# Altium footprint library connectors.PcbLib: 256 footprints (part 3 of 16)
Each footprint in its own frame and in the unit in brackets; x right, y up, seen from the top. Pads: shape width x height; smd on the part's side, far side on the other; paste and mask are expansions set on the pad; w line width, h text height; cw(c..) or ccw(c..) is an arc to the next point about the centre after c.
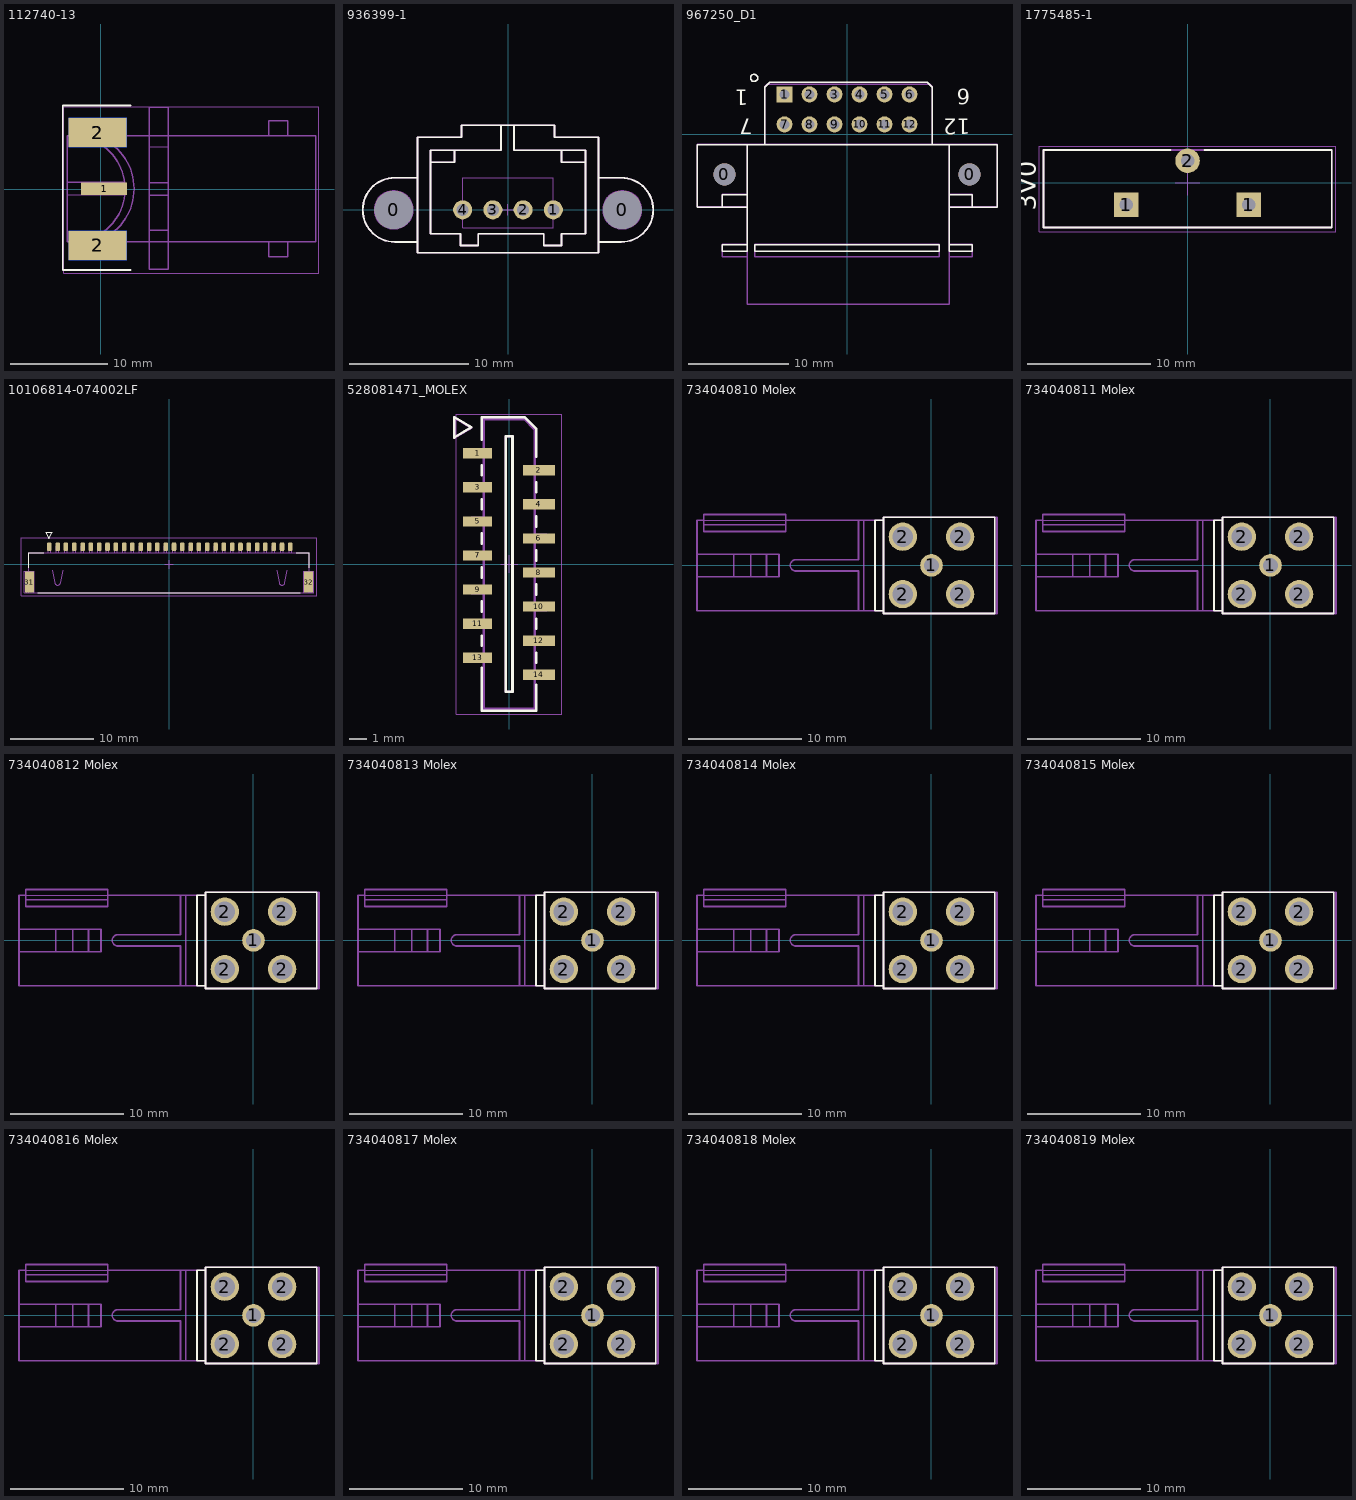
[diagram p2: the footprints below, top view; thin cyan lines are the x and y axes]

## 112740-13 [mm] "AMPHENOL RF Connector, BNC End Launch Jack for 1.57 mm PCB, 75 Ohm, Bulkhead, Includes 14mm Hex Nut"
pads (5):
  rect 4.73x1.27 smd: 1(0.33,0.025)
  rect 6x3 smd: 2(-0.33,-5.824) 2(-0.33,5.824)
  rect 6x3 smd far side: 2(-0.33,-5.824) 2(-0.33,5.824)
Top Overlay:
  lines w0.2: 3.075,-8.375 -3.925,-8.375 -3.925,8.6 3.075,8.6
TopAssy 13:
  lines w0.15: -3.475,-0.65 2.45,-0.575 ; -3.475,0.7 2.475,0.675 ; -3.45,-5.45 ccw(c-2.97,-0.001) -3.425,5.45 ; -0.692,5.521 cw(c-2.3,0.025) -0.687,-5.469 ; 4.95,0.65 6.95,0.65 ; 4.95,4.35 7.025,4.3 ; 4.975,-4.25 6.95,-4.275 ; 4.975,-0.625 6.95,-0.625 ; 17.325,-5.45 17.325,-7 19.3,-7 19.3,-5.45 ; 17.325,5.5 17.325,7.05 19.3,7.05 19.3,5.5 ; -3.475,-5.45 22.175,-5.45 22.175,5.5 -3.475,5.5 -3.475,-5.45 ; 4.975,-8.275 6.95,-8.275 6.95,8.425 4.975,8.425 4.975,-8.275
TopCourt 15:
  lines w0.05: -0.5,0 0.5,0 ; 0,-0.475 0,0.475 ; -3.8,-8.7 -3.8,8.5 22.5,8.5 22.5,-8.7 -3.8,-8.7
3D body "User Library-User Library-112740_xx_iges_file (3)-1.step": height 8.54, standoff -7.46, extent -3.353,-8.242 22.197,8.242

## 936399-1 [mm] "AMPHENOL RF Connector, BNC End Launch Jack for 1.57 mm PCB, 75 Ohm, Bulkhead, Includes 14mm Hex Nut"
pads (6):
  round 3.2 hole 3.2 unplated: 0(-9.6,0) 0(9.6,0)
  round 1.6 hole 1: 1(3.81,0) 2(1.27,0) 3(-1.27,0) 4(-3.81,0)
Top Overlay:
  lines w0.15: -6.5,4 -4.5,4 -4.5,5 ; -0.6,7.1 -0.6,5 -5.5,5 -6.5,5 -6.5,-2 -4,-2 -4,-3 -2.5,-3 -2.5,-2 3,-2 3,-3 4.5,-3 4.5,-2 6.5,-2 6.5,5 0.5,5 0.5,7 ; 4.5,5 4.5,4 6.5,4 ; -7.6,-2.7 -9.5,-2.7 cw(c-9.5,0) -9.5,2.7 -7.6,2.7 ; -7.6,-2.7 -7.6,-3.6 7.6,-3.6 7.6,-2.7 ; -7.6,-2.7 -7.6,2.7 ; -7.6,2.7 -7.6,6.1 -3.9,6.1 -3.9,7.1 3.9,7.1 3.9,6.1 7.6,6.1 7.6,2.7 ; 7.6,-2.7 9.5,-2.7 ccw(c9.5,0) 9.5,2.7 7.6,2.7 ; 7.6,-2.7 7.6,2.7
Bottom Overlay:
  circle w0.15: c-9.6,0 r3
  circle w0.15: c9.6,0 r3
TopAssy 13:
  circle w0.15: c-9.6,0 r1.6
  circle w0.15: c9.6,0 r1.6
  lines w0.15: -6.5,4 -4.5,4 -4.5,5 ; -0.6,7.1 -0.6,5 -5.5,5 -6.5,5 -6.5,-2 -4,-2 -4,-3 -2.5,-3 -2.5,-2 3,-2 3,-3 4.5,-3 4.5,-2 6.5,-2 6.5,5 0.5,5 0.5,7 ; 4.5,5 4.5,4 6.5,4 ; -7.6,-2.7 -7.6,2.7 ; -7.6,-2.7 -7.6,-3.6 7.6,-3.6 7.6,-2.7 ; -7.6,-2.7 -9.5,-2.7 cw(c-9.5,0) -9.5,2.7 -7.6,2.7 ; -7.6,2.7 -7.6,6.1 -3.9,6.1 -3.9,7.1 3.9,7.1 3.9,6.1 7.6,6.1 7.6,2.7 ; 7.6,-2.7 7.6,2.7 ; 7.6,-2.7 9.5,-2.7 ccw(c9.5,0) 9.5,2.7 7.6,2.7
TopCourt 15:
  lines w0.05: -0.5,0 0.5,0 ; 0,-0.475 0,0.475 ; -3.8,-1.5 3.8,-1.5 3.8,2.7 -3.8,2.7 -3.8,-1.5
3D body "c-936399-1-a-3d.stp": height 22.01, standoff -3.49, extent -12.1,-4.5 12.1,7

## 967250_D1 [mm]
pads (14):
  round 2.2 hole 2.2 unplated: 0(-12.25,-4) 0(12.25,-4)
  rect 1.6x1.6 hole 1: 1(-6.25,4)
  round 1.6 hole 1: 2(-3.75,4) 3(-1.25,4) 4(1.25,4) 5(3.75,4) 6(6.25,4) 7(-6.25,1) 8(-3.75,1) 9(-1.25,1) 10(1.25,1) 11(3.75,1) 12(6.25,1)
Top Overlay:
  circle w0.15: c-9.289,5.65 r0.361
  lines w0.15: -12.5,-7.3 -12.5,-6.05 -10,-6.05 ; -10,-11.05 -12.5,-11.05 -12.5,-11.7 -10,-11.7 -10,-1.05 ; -10,-7.3 -15,-7.3 -15,-1.05 -10,-1.05 ; -8.25,-1.05 -8.25,4.7 -7.75,5.2 8,5.2 8.5,4.7 8.5,-1.05 ; 10.25,-11.05 12.5,-11.05 12.5,-11.7 10.25,-11.7 10.25,-1.05 ; 10.25,-7.3 15,-7.3 15,-1.05 10.25,-1.05 ; 10.25,-6.05 12.5,-6.05 12.5,-7.3 ; -10,-1.05 10.25,-1.05 ; -9.25,-11.7 -9.25,-11.05 9.25,-11.05 9.25,-11.7 -9.25,-11.7
  text "1" at -9.85,4.45 h1.52
  text "7" at -9.45,1.55 h1.52
  text "6" at 12.35,4.55 h1.52
  text "12" at 12.35,1.55 h1.52
TopAssy 13:
  lines w0.15: -12.5,-7.25 -12.5,-6 -10,-6 ; -10,-12.25 -12.5,-12.25 -12.5,-11 -10,-11 ; -10,-7.25 -15,-7.25 -15,-1 -10,-1 ; -8.25,-1 -8.25,4.75 -8,5 8.25,5 8.5,4.75 8.5,-1 ; 10.25,-12.25 12.5,-12.25 12.5,-11 10.25,-11 ; 10.25,-7.25 15,-7.25 15,-1 10.25,-1 ; 10.25,-6 12.5,-6 12.5,-7.25 ; -10,-1 -10,-17 10.25,-17 10.25,-1 ; -10,-1 10.25,-1 ; -9.25,-12.25 -9.25,-11 9.25,-11 9.25,-12.25 -9.25,-12.25
3D body "c-0967250-01-d-3d.stp": height 21.6, standoff -3.3, extent -15,-17 15,4.7

## 1775485-1 [mm] "CR2032 Battery Holder"
height 21
pads (3):
  rect 2x2 hole 1.1: 1(-5,-1.8) 1(5,-1.8)
  round 2 hole 1.1: 2(0,1.8)
Top Overlay:
  lines w0.15: -1.375,2.675 -11.75,2.675 -11.75,-3.625 11.75,-3.625 11.75,2.675 1.375,2.675
  text "3V0" at -12.354,-2.292 h1.52
TopAssy 13:
  lines w0.15: -11.75,-3.625 -11.75,2.675 11.75,2.675 11.75,-3.625 -11.75,-3.625
TopCourt 15:
  lines w0.05: -1,0 1,0 ; 0,-1 0,1 ; -12.1,-4 12.1,-4 12.1,3 -12.1,3 -12.1,-4
3D body "User Library-TE_2-1775485-1_CR2032.STEP": height 18.55, standoff -3.95, extent -11.5,-3.375 11.5,2.425

## 10106814-074002LF [mm] "0.5 mm Contact Pitch, Board-to-Board FCI / Amphenol:"
height 3.5
pads (32):
  rrect50% 0.55x1 smd: 1(-14.4,2.125) 2(-13.4,2.125) 3(-12.4,2.125) 4(-11.4,2.125) 5(-10.4,2.125) 6(-9.4,2.125) 7(-8.4,2.125) 8(-7.4,2.125) 9(-6.4,2.125) 10(-5.4,2.125) 11(-4.4,2.125) 12(-3.4,2.125) 13(-2.4,2.125) 14(-1.4,2.125) 15(-0.4,2.125) 16(0.6,2.125) 17(1.6,2.125) 18(2.6,2.125) 19(3.6,2.125) 20(4.6,2.125) 21(5.6,2.125) 22(6.6,2.125) 23(7.6,2.125) 24(8.6,2.125) 25(9.6,2.125) 26(10.6,2.125) 27(11.6,2.125) 28(12.6,2.125) 29(13.6,2.125) 30(14.6,2.125)
  rect 1.1x2.5 smd: 31(-16.8,-2.125) 32(16.8,-2.125)
Top Overlay:
  lines w0.15: -16.9,-0.425 -16.9,1.375 -15.1,1.375 ; -15.8,-3.425 15.8,-3.425 ; 15.3,1.375 16.9,1.375 16.9,-0.425 ; -14.85,3.9 -14.05,3.9 -14.45,3.1 -14.85,3.9
TopAssy 13:
  lines w0.15: -17.1,-3.4 -17.1,-0.8 ; -14.55,1.4 -14.55,2.2 -14.25,2.2 -14.25,1.4 ; -14.05,-0.7 -13.75,-2.2 ccw(c-13.4,-2.15) -13.05,-2.2 -12.75,-0.7 ; -13.55,1.4 -13.55,2.2 -13.25,2.2 -13.25,1.4 ; -12.55,1.4 -12.55,2.2 -12.25,2.2 -12.25,1.4 ; -11.55,1.4 -11.55,2.2 -11.25,2.2 -11.25,1.4 ; -10.55,1.4 -10.55,2.2 -10.25,2.2 -10.25,1.4 ; -9.55,1.4 -9.55,2.2 -9.25,2.2 -9.25,1.4 ; -8.55,1.4 -8.55,2.2 -8.25,2.2 -8.25,1.4 ; -7.55,1.4 -7.55,2.2 -7.25,2.2 -7.25,1.4 ; -6.55,1.4 -6.55,2.2 -6.25,2.2 -6.25,1.4 ; -5.55,1.4 -5.55,2.2 -5.25,2.2 -5.25,1.4 ; -4.55,1.4 -4.55,2.2 -4.25,2.2 -4.25,1.4 ; -3.55,1.4 -3.55,2.2 -3.25,2.2 -3.25,1.4 ; -2.55,1.4 -2.55,2.2 -2.25,2.2 -2.25,1.4 ; -1.55,1.4 -1.55,2.2 -1.25,2.2 -1.25,1.4 ; -0.55,1.4 -0.55,2.2 -0.25,2.2 -0.25,1.4 ; 0.45,1.4 0.45,2.2 0.75,2.2 0.75,1.4 ; 1.45,1.4 1.45,2.2 1.75,2.2 1.75,1.4 ; 2.45,1.4 2.45,2.2 2.75,2.2 2.75,1.4 ; 3.45,1.4 3.45,2.2 3.75,2.2 3.75,1.4 ; 4.45,1.4 4.45,2.2 4.75,2.2 4.75,1.4 ; 5.45,1.4 5.45,2.2 5.75,2.2 5.75,1.4 ; 6.45,1.4 6.45,2.2 6.75,2.2 6.75,1.4 ; 7.45,1.4 7.45,2.2 7.75,2.2 7.75,1.4 ; 8.45,1.4 8.45,2.2 8.75,2.2 8.75,1.4 ; 9.45,1.4 9.45,2.2 9.75,2.2 9.75,1.4 ; 10.45,1.4 10.45,2.2 10.75,2.2 10.75,1.4 ; 11.45,1.4 11.45,2.2 11.75,2.2 11.75,1.4 ; 12.45,1.4 12.45,2.2 12.75,2.2 12.75,1.4 ; 12.95,-0.7 13.25,-2.2 ccw(c13.6,-2.15) 13.95,-2.2 14.25,-0.7 ; 13.45,1.4 13.45,2.2 13.75,2.2 13.75,1.4 ; 14.45,1.4 14.45,2.2 14.75,2.2 14.75,1.4 ; 17.1,-3.4 17.1,-0.8 ; -17.4,-3.4 -17.4,-0.8 -16.2,-0.8 -16.2,-3.4 -17.4,-3.4 ; -16.9,-3.4 -16.9,1.375 16.9,1.375 16.9,-3.4 -16.9,-3.4 ; 16.2,-3.4 17.4,-3.4 17.4,-0.8 16.2,-0.8 16.2,-3.4
TopCourt 15:
  lines w0.05: -0.5,0 0.5,0 ; 0,-0.5 0,0.5 ; -17.8,-3.8 17.8,-3.8 17.8,3.2 -17.8,3.2 -17.8,-3.8
3D body "10106814074002lf.stp": height 5.73, standoff 0.68, extent -10.025,-1.525 9.975,4.175

## 528081471_MOLEX [mm] "14 pins 1.0mm ZIF FPC"
height 5.05
pads (14):
  rect 1.7x0.6 smd: 1(-1.85,6.5) 3(-1.85,4.5) 5(-1.85,2.5) 7(-1.85,0.5) 9(-1.85,-1.5) 11(-1.85,-3.5) 13(-1.85,-5.5)
  rect 1.9x0.6 smd: 2(1.75,5.5) 4(1.75,3.5) 6(1.75,1.5) 8(1.75,-0.5) 10(1.75,-2.5) 12(1.75,-4.5) 14(1.75,-6.5)
Top Overlay:
  lines w0.15: -1.6,-6.1 -1.6,-8.6 1.6,-8.6 1.6,-7.1 ; -1.6,-4.8 -1.6,-4.2 ; -1.6,-2.8 -1.6,-2.2 ; -1.6,-0.8 -1.6,-0.2 ; -1.6,1.2 -1.6,1.8 ; -1.6,3.2 -1.6,3.8 ; -1.6,5.2 -1.6,5.8 ; -1.6,7.3 -1.6,8.6 0.92,8.6 1.6,7.92 1.6,6.3 ; 1.6,-5.8 1.6,-5.2 ; 1.6,-3.8 1.6,-3.2 ; 1.6,-1.8 1.6,-1.2 ; 1.6,0.2 1.6,0.8 ; 1.6,2.2 1.6,2.8 ; 1.6,4.2 1.6,4.8 ; -3.231,7.42 -2.231,8.02 -3.231,8.62 -3.231,7.42 ; -0.2,-7.5 0.2,-7.5 0.2,7.5 -0.2,7.5 -0.2,-7.5
TopAssy 13:
  lines w0.15: -1.5,-5.7 -2.2,-5.7 -2.2,-5.3 -1.5,-5.3 ; -1.5,-3.7 -2.2,-3.7 -2.2,-3.3 -1.5,-3.3 ; -1.5,-1.7 -2.2,-1.7 -2.2,-1.3 -1.5,-1.3 ; -1.5,0.3 -2.2,0.3 -2.2,0.7 -1.5,0.7 ; -1.5,2.3 -2.2,2.3 -2.2,2.7 -1.5,2.7 ; -1.5,4.3 -2.2,4.3 -2.2,4.7 -1.5,4.7 ; -1.5,6.3 -2.2,6.3 -2.2,6.7 -1.5,6.7 ; 1.5,-6.7 2.2,-6.7 2.2,-6.3 1.5,-6.3 ; 1.5,-4.7 2.2,-4.7 2.2,-4.3 1.5,-4.3 ; 1.5,-2.7 2.2,-2.7 2.2,-2.3 1.5,-2.3 ; 1.5,-0.7 2.2,-0.7 2.2,-0.3 1.5,-0.3 ; 1.5,1.3 2.2,1.3 2.2,1.7 1.5,1.7 ; 1.5,3.3 2.2,3.3 2.2,3.7 1.5,3.7 ; 1.5,5.3 2.2,5.3 2.2,5.7 1.5,5.7 ; -3.231,7.4 -3.231,8.6 -2.231,8 -3.231,7.4 ; -1.5,-8.5 1.5,-8.5 1.5,7.9 0.9,8.5 -1.5,8.5 -1.5,-8.5 ; -0.2,-7.5 -0.2,7.5 0.2,7.5 0.2,-7.5 -0.2,-7.5
TopCourt 15:
  lines w0.05: -0.5,0 0.5,0 ; 0,-0.5 0,0.5 ; -3.1,-8.8 3.1,-8.8 3.1,8.8 -3.1,8.8 -3.1,-8.8
3D body "528081471.stp": height 5.11, standoff 0.01, extent -2.25,-8.5 2.25,8.5

## 734040810 Molex [mm] "FAKRA A BLACK"
height 9
pads (5):
  round 2 hole 1.3: 1(0,0)
  round 2.5 hole 1.8: 2(-2.54,-2.54) 2(-2.54,2.54) 2(2.54,-2.54) 2(2.54,2.54)
Top Overlay:
  lines w0.15: -4.25,-4 -5,-4 -5,4 -4.25,4 ; -4.25,-4.25 5.6,-4.25 5.6,4.25 -4.25,4.25 -4.25,-4.25
TopAssy 13:
  lines w0.15: -20.75,-1 -13.5,-1 -13.5,1 -20.75,1 ; -20.2,4 -20.75,4 -20.75,-4 -4.25,-4 ; -20.15,3.6 -12.9,3.6 ; -17.5,-1 -17.5,1 ; -16,-1 -16,1 ; -14.6,-1 -14.6,1 ; -12.9,4 -4.25,4 ; -6.45,-4 -6.45,-0.5 -12,-0.5 cw(c-12,0) -12,0.5 -6.45,0.5 -6.45,4 ; -6,-4 -6,3.9 ; -5,-4 -5,4 ; 5.6,-4.25 5.6,4.25 ; -20.15,3 -12.9,3 -12.9,4.5 -20.15,4.5 -20.15,3 ; -4.25,-4.25 5.8,-4.25 5.8,4.25 -4.25,4.25 -4.25,-4.25
TopCourt 15:
  lines w0.05: -4.25,-4 -20.75,-4 -20.75,4 -4.25,4 ; -4.25,-4.25 -4.25,4.25 5.8,4.25 5.8,-4.25 -4.25,-4.25
3D body "734040810.stp": height 11.27, standoff -2.78, extent -20.225,-4 5.495,4

## 734040811 Molex [mm] "FAKRA Code B/Signal White"
height 9
pads (5):
  round 2 hole 1.3: 1(0,0)
  round 2.5 hole 1.8: 2(-2.54,-2.54) 2(-2.54,2.54) 2(2.54,-2.54) 2(2.54,2.54)
Top Overlay:
  lines w0.15: -4.25,-4 -5,-4 -5,4 -4.25,4 ; -4.25,-4.25 5.6,-4.25 5.6,4.25 -4.25,4.25 -4.25,-4.25
TopAssy 13:
  lines w0.15: -20.75,-1 -13.5,-1 -13.5,1 -20.75,1 ; -20.2,4 -20.75,4 -20.75,-4 -4.25,-4 ; -20.15,3.6 -12.9,3.6 ; -17.5,-1 -17.5,1 ; -16,-1 -16,1 ; -14.6,-1 -14.6,1 ; -12.9,4 -4.25,4 ; -6.45,-4 -6.45,-0.5 -12,-0.5 cw(c-12,0) -12,0.5 -6.45,0.5 -6.45,4 ; -6,-4 -6,3.9 ; -5,-4 -5,4 ; 5.6,-4.25 5.6,4.25 ; -20.15,3 -12.9,3 -12.9,4.5 -20.15,4.5 -20.15,3 ; -4.25,-4.25 5.8,-4.25 5.8,4.25 -4.25,4.25 -4.25,-4.25
TopCourt 15:
  lines w0.05: -4.25,-4 -20.75,-4 -20.75,4 -4.25,4 ; -4.25,-4.25 -4.25,4.25 5.8,4.25 5.8,-4.25 -4.25,-4.25
3D body "734040811.stp": height 11.27, standoff -2.78, extent -20.225,-4 5.495,4

## 734040812 Molex [mm] "FAKRA Code C/Blue"
height 9
pads (5):
  round 2 hole 1.3: 1(0,0)
  round 2.5 hole 1.8: 2(-2.54,-2.54) 2(-2.54,2.54) 2(2.54,-2.54) 2(2.54,2.54)
Top Overlay:
  lines w0.15: -4.25,-4 -5,-4 -5,4 -4.25,4 ; -4.25,-4.25 -4.25,4.25 5.6,4.25 5.6,-4.25 -4.25,-4.25
TopAssy 13:
  lines w0.15: -20.75,-1 -13.5,-1 -13.5,1 -20.75,1 ; -20.2,4 -20.75,4 -20.75,-4 -4.25,-4 ; -20.15,3.6 -12.9,3.6 ; -17.5,-1 -17.5,1 ; -16,-1 -16,1 ; -14.6,-1 -14.6,1 ; -12.9,4 -4.25,4 ; -6.45,-4 -6.45,-0.5 -12,-0.5 cw(c-12,0) -12,0.5 -6.45,0.5 -6.45,4 ; -6,-4 -6,3.9 ; -5,-4 -5,4 ; 5.6,-4.25 5.6,4.25 ; -20.15,3 -20.15,4.5 -12.9,4.5 -12.9,3 -20.15,3 ; -4.25,-4.25 -4.25,4.25 5.8,4.25 5.8,-4.25 -4.25,-4.25
TopCourt 15:
  lines w0.05: -4.25,-4 -20.75,-4 -20.75,4 -4.25,4 ; -4.25,-4.25 5.8,-4.25 5.8,4.25 -4.25,4.25 -4.25,-4.25
3D body "734040812.stp": height 11.27, standoff -2.78, extent -20.225,-4 5.495,4

## 734040813 Molex [mm] "FAKRA Code D/Bordeaux Violet"
height 9
pads (5):
  round 2 hole 1.3: 1(0,0)
  round 2.5 hole 1.8: 2(-2.54,-2.54) 2(-2.54,2.54) 2(2.54,-2.54) 2(2.54,2.54)
Top Overlay:
  lines w0.15: -4.25,-4 -5,-4 -5,4 -4.25,4 ; -4.25,-4.25 -4.25,4.25 5.6,4.25 5.6,-4.25 -4.25,-4.25
TopAssy 13:
  lines w0.15: -20.75,-1 -13.5,-1 -13.5,1 -20.75,1 ; -20.2,4 -20.75,4 -20.75,-4 -4.25,-4 ; -20.15,3.6 -12.9,3.6 ; -17.5,-1 -17.5,1 ; -16,-1 -16,1 ; -14.6,-1 -14.6,1 ; -12.9,4 -4.25,4 ; -6.45,-4 -6.45,-0.5 -12,-0.5 cw(c-12,0) -12,0.5 -6.45,0.5 -6.45,4 ; -6,-4 -6,3.9 ; -5,-4 -5,4 ; 5.6,-4.25 5.6,4.25 ; -20.15,3 -20.15,4.5 -12.9,4.5 -12.9,3 -20.15,3 ; -4.25,-4.25 -4.25,4.25 5.8,4.25 5.8,-4.25 -4.25,-4.25
TopCourt 15:
  lines w0.05: -4.25,-4 -20.75,-4 -20.75,4 -4.25,4 ; -4.25,-4.25 5.8,-4.25 5.8,4.25 -4.25,4.25 -4.25,-4.25
3D body "734040813.stp": height 11.27, standoff -2.78, extent -20.225,-4 5.495,4

## 734040814 Molex [mm] "FAKRA Code E/Green"
height 9
pads (5):
  round 2 hole 1.3: 1(0,0)
  round 2.5 hole 1.8: 2(-2.54,-2.54) 2(-2.54,2.54) 2(2.54,-2.54) 2(2.54,2.54)
Top Overlay:
  lines w0.15: -4.25,-4 -5,-4 -5,4 -4.25,4 ; -4.25,-4.25 5.6,-4.25 5.6,4.25 -4.25,4.25 -4.25,-4.25
TopAssy 13:
  lines w0.15: -20.75,-1 -13.5,-1 -13.5,1 -20.75,1 ; -20.2,4 -20.75,4 -20.75,-4 -4.25,-4 ; -20.15,3.6 -12.9,3.6 ; -17.5,-1 -17.5,1 ; -16,-1 -16,1 ; -14.6,-1 -14.6,1 ; -12.9,4 -4.25,4 ; -6.45,-4 -6.45,-0.5 -12,-0.5 cw(c-12,0) -12,0.5 -6.45,0.5 -6.45,4 ; -6,-4 -6,3.9 ; -5,-4 -5,4 ; 5.6,-4.25 5.6,4.25 ; -20.15,3 -12.9,3 -12.9,4.5 -20.15,4.5 -20.15,3 ; -4.25,-4.25 5.8,-4.25 5.8,4.25 -4.25,4.25 -4.25,-4.25
TopCourt 15:
  lines w0.05: -4.25,-4 -20.75,-4 -20.75,4 -4.25,4 ; -4.25,-4.25 -4.25,4.25 5.8,4.25 5.8,-4.25 -4.25,-4.25
3D body "734040814.stp": height 11.27, standoff -2.78, extent -20.225,-4 5.495,4

## 734040815 Molex [mm] "FAKRA Code F/Brown"
height 9
pads (5):
  round 2 hole 1.3: 1(0,0)
  round 2.5 hole 1.8: 2(-2.54,-2.54) 2(-2.54,2.54) 2(2.54,-2.54) 2(2.54,2.54)
Top Overlay:
  lines w0.15: -4.25,-4 -5,-4 -5,4 -4.25,4 ; -4.25,-4.25 -4.25,4.25 5.6,4.25 5.6,-4.25 -4.25,-4.25
TopAssy 13:
  lines w0.15: -20.75,-1 -13.5,-1 -13.5,1 -20.75,1 ; -20.2,4 -20.75,4 -20.75,-4 -4.25,-4 ; -20.15,3.6 -12.9,3.6 ; -17.5,-1 -17.5,1 ; -16,-1 -16,1 ; -14.6,-1 -14.6,1 ; -12.9,4 -4.25,4 ; -6.45,-4 -6.45,-0.5 -12,-0.5 cw(c-12,0) -12,0.5 -6.45,0.5 -6.45,4 ; -6,-4 -6,3.9 ; -5,-4 -5,4 ; 5.6,-4.25 5.6,4.25 ; -20.15,3 -20.15,4.5 -12.9,4.5 -12.9,3 -20.15,3 ; -4.25,-4.25 -4.25,4.25 5.8,4.25 5.8,-4.25 -4.25,-4.25
TopCourt 15:
  lines w0.05: -4.25,-4 -20.75,-4 -20.75,4 -4.25,4 ; -4.25,-4.25 5.8,-4.25 5.8,4.25 -4.25,4.25 -4.25,-4.25
3D body "734040815.stp": height 11.27, standoff -2.78, extent -20.225,-4 5.495,4

## 734040816 Molex [mm] "FAKRA Code G/Gray"
height 9
pads (5):
  round 2 hole 1.3: 1(0,0)
  round 2.5 hole 1.8: 2(-2.54,-2.54) 2(-2.54,2.54) 2(2.54,-2.54) 2(2.54,2.54)
Top Overlay:
  lines w0.15: -4.25,-4 -5,-4 -5,4 -4.25,4 ; -4.25,-4.25 -4.25,4.25 5.6,4.25 5.6,-4.25 -4.25,-4.25
TopAssy 13:
  lines w0.15: -20.75,-1 -13.5,-1 -13.5,1 -20.75,1 ; -20.2,4 -20.75,4 -20.75,-4 -4.25,-4 ; -20.15,3.6 -12.9,3.6 ; -17.5,-1 -17.5,1 ; -16,-1 -16,1 ; -14.6,-1 -14.6,1 ; -12.9,4 -4.25,4 ; -6.45,-4 -6.45,-0.5 -12,-0.5 cw(c-12,0) -12,0.5 -6.45,0.5 -6.45,4 ; -6,-4 -6,3.9 ; -5,-4 -5,4 ; 5.6,-4.25 5.6,4.25 ; -20.15,3 -20.15,4.5 -12.9,4.5 -12.9,3 -20.15,3 ; -4.25,-4.25 -4.25,4.25 5.8,4.25 5.8,-4.25 -4.25,-4.25
TopCourt 15:
  lines w0.05: -4.25,-4 -20.75,-4 -20.75,4 -4.25,4 ; -4.25,-4.25 5.8,-4.25 5.8,4.25 -4.25,4.25 -4.25,-4.25
3D body "734040816.stp": height 11.27, standoff -2.78, extent -20.225,-4 5.495,4

## 734040817 Molex [mm] "FAKRA Code H/Violet"
height 9
pads (5):
  round 2 hole 1.3: 1(0,0)
  round 2.5 hole 1.8: 2(-2.54,-2.54) 2(-2.54,2.54) 2(2.54,-2.54) 2(2.54,2.54)
Top Overlay:
  lines w0.15: -4.25,-4 -5,-4 -5,4 -4.25,4 ; -4.25,-4.25 -4.25,4.25 5.6,4.25 5.6,-4.25 -4.25,-4.25
TopAssy 13:
  lines w0.15: -20.75,-1 -13.5,-1 -13.5,1 -20.75,1 ; -20.2,4 -20.75,4 -20.75,-4 -4.25,-4 ; -20.15,3.6 -12.9,3.6 ; -17.5,-1 -17.5,1 ; -16,-1 -16,1 ; -14.6,-1 -14.6,1 ; -12.9,4 -4.25,4 ; -6.45,-4 -6.45,-0.5 -12,-0.5 cw(c-12,0) -12,0.5 -6.45,0.5 -6.45,4 ; -6,-4 -6,3.9 ; -5,-4 -5,4 ; 5.6,-4.25 5.6,4.25 ; -20.15,3 -20.15,4.5 -12.9,4.5 -12.9,3 -20.15,3 ; -4.25,-4.25 -4.25,4.25 5.8,4.25 5.8,-4.25 -4.25,-4.25
TopCourt 15:
  lines w0.05: -4.25,-4 -20.75,-4 -20.75,4 -4.25,4 ; -4.25,-4.25 5.8,-4.25 5.8,4.25 -4.25,4.25 -4.25,-4.25
3D body "734040817.stp": height 11.27, standoff -2.78, extent -20.225,-4 5.495,4

## 734040818 Molex [mm] "FAKRA Code I/Beige"
height 9
pads (5):
  round 2 hole 1.3: 1(0,0)
  round 2.5 hole 1.8: 2(-2.54,-2.54) 2(-2.54,2.54) 2(2.54,-2.54) 2(2.54,2.54)
Top Overlay:
  lines w0.15: -4.25,-4 -5,-4 -5,4 -4.25,4 ; -4.25,-4.25 -4.25,4.25 5.6,4.25 5.6,-4.25 -4.25,-4.25
TopAssy 13:
  lines w0.15: -20.75,-1 -13.5,-1 -13.5,1 -20.75,1 ; -20.2,4 -20.75,4 -20.75,-4 -4.25,-4 ; -20.15,3.6 -12.9,3.6 ; -17.5,-1 -17.5,1 ; -16,-1 -16,1 ; -14.6,-1 -14.6,1 ; -12.9,4 -4.25,4 ; -6.45,-4 -6.45,-0.5 -12,-0.5 cw(c-12,0) -12,0.5 -6.45,0.5 -6.45,4 ; -6,-4 -6,3.9 ; -5,-4 -5,4 ; 5.6,-4.25 5.6,4.25 ; -20.15,3 -20.15,4.5 -12.9,4.5 -12.9,3 -20.15,3 ; -4.25,-4.25 -4.25,4.25 5.8,4.25 5.8,-4.25 -4.25,-4.25
TopCourt 15:
  lines w0.05: -4.25,-4 -20.75,-4 -20.75,4 -4.25,4 ; -4.25,-4.25 5.8,-4.25 5.8,4.25 -4.25,4.25 -4.25,-4.25
3D body "734040818.stp": height 11.27, standoff -2.78, extent -20.225,-4 5.495,4

## 734040819 Molex [mm] "FAKRA Code K/Curry Yellow"
height 9
pads (5):
  round 2 hole 1.3: 1(0,0)
  round 2.5 hole 1.8: 2(-2.54,-2.54) 2(-2.54,2.54) 2(2.54,-2.54) 2(2.54,2.54)
Top Overlay:
  lines w0.15: -4.25,-4 -5,-4 -5,4 -4.25,4 ; -4.25,-4.25 -4.25,4.25 5.6,4.25 5.6,-4.25 -4.25,-4.25
TopAssy 13:
  lines w0.15: -20.75,-1 -13.5,-1 -13.5,1 -20.75,1 ; -20.2,4 -20.75,4 -20.75,-4 -4.25,-4 ; -20.15,3.6 -12.9,3.6 ; -17.5,-1 -17.5,1 ; -16,-1 -16,1 ; -14.6,-1 -14.6,1 ; -12.9,4 -4.25,4 ; -6.45,-4 -6.45,-0.5 -12,-0.5 cw(c-12,0) -12,0.5 -6.45,0.5 -6.45,4 ; -6,-4 -6,3.9 ; -5,-4 -5,4 ; 5.6,-4.25 5.6,4.25 ; -20.15,3 -20.15,4.5 -12.9,4.5 -12.9,3 -20.15,3 ; -4.25,-4.25 -4.25,4.25 5.8,4.25 5.8,-4.25 -4.25,-4.25
TopCourt 15:
  lines w0.05: -4.25,-4 -20.75,-4 -20.75,4 -4.25,4 ; -4.25,-4.25 5.8,-4.25 5.8,4.25 -4.25,4.25 -4.25,-4.25
3D body "734040819.stp": height 11.27, standoff -2.78, extent -20.225,-4 5.495,4